# Altium footprint library HSD_connectors.PcbLib: 59 footprints (part 5 of 7)
Each footprint in its own frame and in the unit in brackets; x right, y up, seen from the top. Pads: shape width x height; smd on the part's side, far side on the other; paste and mask are expansions set on the pad; w line width, h text height; cw(c..) or ccw(c..) is an arc to the next point about the centre after c.
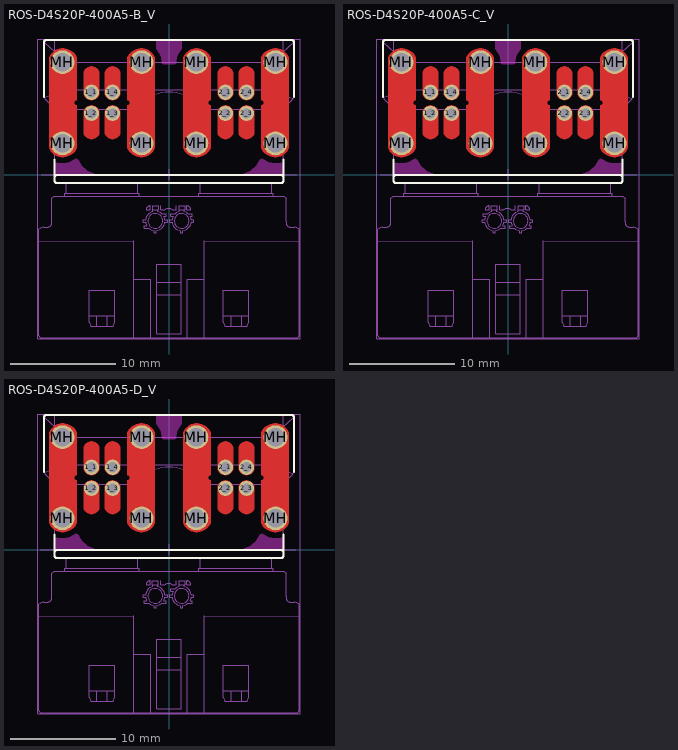
[diagram p4: the footprints below, top view; thin cyan lines are the x and y axes]

## ROS-D4S20P-400A5-B_V [mm] "Dual HSD Right Angle Plug, Edge Mount, 28.25x24.7x8.1mm, Rosenberger Recommended"
height 8.1
pads (16):
  round 1.45 hole 0.95: 1_1(-7.35,7.81) 1_2(-7.35,5.81) 1_3(-5.35,5.81) 1_4(-5.35,7.81) 2_1(5.35,7.81) 2_2(5.35,5.81) 2_3(7.35,5.81) 2_4(7.35,7.81)
  round 2.25 hole 1.75: MH(-10.1,2.96) MH(-10.1,10.66) MH(-2.6,2.96) MH(-2.6,10.66) MH(2.6,2.96) MH(2.6,10.66) MH(10.1,2.96) MH(10.1,10.66)
Top Layer:
  region: -11.35,6.81 -10.1,6.81 -10.1,3.835 -10.214,3.828 -10.435,3.768 -10.633,3.654 -10.794,3.493 -10.908,3.295 -10.968,3.074 -10.968,2.846 -10.908,2.625 -10.794,2.427 -10.633,2.266 -10.435,2.152 -10.214,2.092 -10.1,2.085 -10.1,1.645 -10.2,1.649 -10.396,1.683 -10.586,1.745 -10.765,1.833 -10.93,1.945 -11.078,2.08 -11.205,2.233 -11.31,2.403 -11.35,2.494
  region: -8.1,4.11 -8.1,4.036 -8.071,3.891 -8.015,3.755 -7.933,3.632 -7.828,3.527 -7.705,3.445 -7.569,3.389 -7.424,3.36 -7.35,3.36 -7.35,5.335 -7.443,5.344 -7.614,5.415 -7.745,5.546 -7.816,5.717 -7.816,5.903 -7.745,6.074 -7.614,6.205 -7.443,6.276 -7.35,6.285 -7.35,6.56 -7.424,6.56 -7.569,6.531 -7.705,6.475 -7.828,6.393 -7.933,6.288 -8.015,6.165 -8.071,6.029 -8.1,5.884 -8.1,5.81
  region: -11.35,6.81 -10.1,6.81 -10.1,9.785 -10.214,9.792 -10.435,9.852 -10.633,9.966 -10.794,10.127 -10.908,10.325 -10.968,10.546 -10.968,10.774 -10.908,10.995 -10.794,11.193 -10.633,11.354 -10.435,11.468 -10.214,11.528 -10.1,11.535 -10.1,11.975 -10.2,11.971 -10.396,11.937 -10.586,11.875 -10.765,11.787 -10.93,11.675 -11.078,11.54 -11.205,11.387 -11.31,11.217 -11.35,11.126
  region: -1.35,6.81 -2.6,6.81 -2.6,9.785 -2.486,9.792 -2.265,9.852 -2.067,9.966 -1.906,10.127 -1.792,10.325 -1.732,10.546 -1.732,10.774 -1.792,10.995 -1.906,11.193 -2.067,11.354 -2.265,11.468 -2.486,11.528 -2.6,11.535 -2.6,11.975 -2.5,11.971 -2.304,11.937 -2.114,11.875 -1.935,11.787 -1.77,11.675 -1.622,11.54 -1.495,11.387 -1.39,11.217 -1.35,11.126
  region: -1.35,6.81 -2.6,6.81 -2.6,3.835 -2.486,3.828 -2.265,3.768 -2.067,3.654 -1.906,3.493 -1.792,3.295 -1.732,3.074 -1.732,2.846 -1.792,2.625 -1.906,2.427 -2.067,2.266 -2.265,2.152 -2.486,2.092 -2.6,2.085 -2.6,1.645 -2.5,1.649 -2.304,1.683 -2.114,1.745 -1.935,1.833 -1.77,1.945 -1.622,2.08 -1.495,2.233 -1.39,2.403 -1.35,2.494
  region: -6.6,4.11 -6.6,4.036 -6.629,3.891 -6.685,3.755 -6.767,3.632 -6.872,3.527 -6.995,3.445 -7.131,3.389 -7.276,3.36 -7.35,3.36 -7.35,5.335 -7.257,5.344 -7.086,5.415 -6.955,5.546 -6.884,5.717 -6.884,5.903 -6.955,6.074 -7.086,6.205 -7.257,6.276 -7.35,6.285 -7.35,6.56 -7.276,6.56 -7.131,6.531 -6.995,6.475 -6.872,6.393 -6.767,6.288 -6.685,6.165 -6.629,6.029 -6.6,5.884 -6.6,5.81
  region: -6.1,4.11 -6.1,4.036 -6.071,3.891 -6.015,3.755 -5.933,3.632 -5.828,3.527 -5.705,3.445 -5.569,3.389 -5.424,3.36 -5.35,3.36 -5.35,5.335 -5.443,5.344 -5.614,5.415 -5.745,5.546 -5.816,5.717 -5.816,5.903 -5.745,6.074 -5.614,6.205 -5.443,6.276 -5.35,6.285 -5.35,6.56 -5.424,6.56 -5.569,6.531 -5.705,6.475 -5.828,6.393 -5.933,6.288 -6.015,6.165 -6.071,6.029 -6.1,5.884 -6.1,5.81
  region: -4.6,4.11 -4.6,4.036 -4.629,3.891 -4.685,3.755 -4.767,3.632 -4.872,3.527 -4.995,3.445 -5.131,3.389 -5.276,3.36 -5.35,3.36 -5.35,5.335 -5.257,5.344 -5.086,5.415 -4.955,5.546 -4.884,5.717 -4.884,5.903 -4.955,6.074 -5.086,6.205 -5.257,6.276 -5.35,6.285 -5.35,6.56 -5.276,6.56 -5.131,6.531 -4.995,6.475 -4.872,6.393 -4.767,6.288 -4.685,6.165 -4.629,6.029 -4.6,5.884 -4.6,5.81
  region: -6.1,9.51 -6.1,9.584 -6.071,9.729 -6.015,9.865 -5.933,9.988 -5.828,10.093 -5.705,10.175 -5.569,10.231 -5.424,10.26 -5.35,10.26 -5.35,8.285 -5.443,8.276 -5.614,8.205 -5.745,8.074 -5.816,7.903 -5.816,7.717 -5.745,7.546 -5.614,7.415 -5.443,7.344 -5.35,7.335 -5.35,7.06 -5.424,7.06 -5.569,7.089 -5.705,7.145 -5.828,7.227 -5.933,7.332 -6.015,7.455 -6.071,7.591 -6.1,7.736 -6.1,7.81
  region: -4.6,9.51 -4.6,9.584 -4.629,9.729 -4.685,9.865 -4.767,9.988 -4.872,10.093 -4.995,10.175 -5.131,10.231 -5.276,10.26 -5.35,10.26 -5.35,8.285 -5.257,8.276 -5.086,8.205 -4.955,8.074 -4.884,7.903 -4.884,7.717 -4.955,7.546 -5.086,7.415 -5.257,7.344 -5.35,7.335 -5.35,7.06 -5.276,7.06 -5.131,7.089 -4.995,7.145 -4.872,7.227 -4.767,7.332 -4.685,7.455 -4.629,7.591 -4.6,7.736 -4.6,7.81
  region: -6.6,9.51 -6.6,9.584 -6.629,9.729 -6.685,9.865 -6.767,9.988 -6.872,10.093 -6.995,10.175 -7.131,10.231 -7.276,10.26 -7.35,10.26 -7.35,8.285 -7.257,8.276 -7.086,8.205 -6.955,8.074 -6.884,7.903 -6.884,7.717 -6.955,7.546 -7.086,7.415 -7.257,7.344 -7.35,7.335 -7.35,7.06 -7.276,7.06 -7.131,7.089 -6.995,7.145 -6.872,7.227 -6.767,7.332 -6.685,7.455 -6.629,7.591 -6.6,7.736 -6.6,7.81
  region: -8.1,9.51 -8.1,9.584 -8.071,9.729 -8.015,9.865 -7.933,9.988 -7.828,10.093 -7.705,10.175 -7.569,10.231 -7.424,10.26 -7.35,10.26 -7.35,8.285 -7.443,8.276 -7.614,8.205 -7.745,8.074 -7.816,7.903 -7.816,7.717 -7.745,7.546 -7.614,7.415 -7.443,7.344 -7.35,7.335 -7.35,7.06 -7.424,7.06 -7.569,7.089 -7.705,7.145 -7.828,7.227 -7.933,7.332 -8.015,7.455 -8.071,7.591 -8.1,7.736 -8.1,7.81
  region: 8.1,9.51 8.1,9.584 8.071,9.729 8.015,9.865 7.933,9.988 7.828,10.093 7.705,10.175 7.569,10.231 7.424,10.26 7.35,10.26 7.35,8.285 7.443,8.276 7.614,8.205 7.745,8.074 7.816,7.903 7.816,7.717 7.745,7.546 7.614,7.415 7.443,7.344 7.35,7.335 7.35,7.06 7.424,7.06 7.569,7.089 7.705,7.145 7.828,7.227 7.933,7.332 8.015,7.455 8.071,7.591 8.1,7.736 8.1,7.81
  region: 6.6,9.51 6.6,9.584 6.629,9.729 6.685,9.865 6.767,9.988 6.872,10.093 6.995,10.175 7.131,10.231 7.276,10.26 7.35,10.26 7.35,8.285 7.257,8.276 7.086,8.205 6.955,8.074 6.884,7.903 6.884,7.717 6.955,7.546 7.086,7.415 7.257,7.344 7.35,7.335 7.35,7.06 7.276,7.06 7.131,7.089 6.995,7.145 6.872,7.227 6.767,7.332 6.685,7.455 6.629,7.591 6.6,7.736 6.6,7.81
  region: 4.6,9.51 4.6,9.584 4.629,9.729 4.685,9.865 4.767,9.988 4.872,10.093 4.995,10.175 5.131,10.231 5.276,10.26 5.35,10.26 5.35,8.285 5.257,8.276 5.086,8.205 4.955,8.074 4.884,7.903 4.884,7.717 4.955,7.546 5.086,7.415 5.257,7.344 5.35,7.335 5.35,7.06 5.276,7.06 5.131,7.089 4.995,7.145 4.872,7.227 4.767,7.332 4.685,7.455 4.629,7.591 4.6,7.736 4.6,7.81
  region: 6.1,9.51 6.1,9.584 6.071,9.729 6.015,9.865 5.933,9.988 5.828,10.093 5.705,10.175 5.569,10.231 5.424,10.26 5.35,10.26 5.35,8.285 5.443,8.276 5.614,8.205 5.745,8.074 5.816,7.903 5.816,7.717 5.745,7.546 5.614,7.415 5.443,7.344 5.35,7.335 5.35,7.06 5.424,7.06 5.569,7.089 5.705,7.145 5.828,7.227 5.933,7.332 6.015,7.455 6.071,7.591 6.1,7.736 6.1,7.81
  region: 4.6,4.11 4.6,4.036 4.629,3.891 4.685,3.755 4.767,3.632 4.872,3.527 4.995,3.445 5.131,3.389 5.276,3.36 5.35,3.36 5.35,5.335 5.257,5.344 5.086,5.415 4.955,5.546 4.884,5.717 4.884,5.903 4.955,6.074 5.086,6.205 5.257,6.276 5.35,6.285 5.35,6.56 5.276,6.56 5.131,6.531 4.995,6.475 4.872,6.393 4.767,6.288 4.685,6.165 4.629,6.029 4.6,5.884 4.6,5.81
  region: 6.1,4.11 6.1,4.036 6.071,3.891 6.015,3.755 5.933,3.632 5.828,3.527 5.705,3.445 5.569,3.389 5.424,3.36 5.35,3.36 5.35,5.335 5.443,5.344 5.614,5.415 5.745,5.546 5.816,5.717 5.816,5.903 5.745,6.074 5.614,6.205 5.443,6.276 5.35,6.285 5.35,6.56 5.424,6.56 5.569,6.531 5.705,6.475 5.828,6.393 5.933,6.288 6.015,6.165 6.071,6.029 6.1,5.884 6.1,5.81
  region: 6.6,4.11 6.6,4.036 6.629,3.891 6.685,3.755 6.767,3.632 6.872,3.527 6.995,3.445 7.131,3.389 7.276,3.36 7.35,3.36 7.35,5.335 7.257,5.344 7.086,5.415 6.955,5.546 6.884,5.717 6.884,5.903 6.955,6.074 7.086,6.205 7.257,6.276 7.35,6.285 7.35,6.56 7.276,6.56 7.131,6.531 6.995,6.475 6.872,6.393 6.767,6.288 6.685,6.165 6.629,6.029 6.6,5.884 6.6,5.81
  region: 1.35,6.81 2.6,6.81 2.6,3.835 2.486,3.828 2.265,3.768 2.067,3.654 1.906,3.493 1.792,3.295 1.732,3.074 1.732,2.846 1.792,2.625 1.906,2.427 2.067,2.266 2.265,2.152 2.486,2.092 2.6,2.085 2.6,1.645 2.5,1.649 2.304,1.683 2.114,1.745 1.935,1.833 1.77,1.945 1.622,2.08 1.495,2.233 1.39,2.403 1.35,2.494
  region: 1.35,6.81 2.6,6.81 2.6,9.785 2.486,9.792 2.265,9.852 2.067,9.966 1.906,10.127 1.792,10.325 1.732,10.546 1.732,10.774 1.792,10.995 1.906,11.193 2.067,11.354 2.265,11.468 2.486,11.528 2.6,11.535 2.6,11.975 2.5,11.971 2.304,11.937 2.114,11.875 1.935,11.787 1.77,11.675 1.622,11.54 1.495,11.387 1.39,11.217 1.35,11.126
  region: 11.35,6.81 10.1,6.81 10.1,9.785 10.214,9.792 10.435,9.852 10.633,9.966 10.794,10.127 10.908,10.325 10.968,10.546 10.968,10.774 10.908,10.995 10.794,11.193 10.633,11.354 10.435,11.468 10.214,11.528 10.1,11.535 10.1,11.975 10.2,11.971 10.396,11.937 10.586,11.875 10.765,11.787 10.93,11.675 11.078,11.54 11.205,11.387 11.31,11.217 11.35,11.126
  region: 8.1,4.11 8.1,4.036 8.071,3.891 8.015,3.755 7.933,3.632 7.828,3.527 7.705,3.445 7.569,3.389 7.424,3.36 7.35,3.36 7.35,5.335 7.443,5.344 7.614,5.415 7.745,5.546 7.816,5.717 7.816,5.903 7.745,6.074 7.614,6.205 7.443,6.276 7.35,6.285 7.35,6.56 7.424,6.56 7.569,6.531 7.705,6.475 7.828,6.393 7.933,6.288 8.015,6.165 8.071,6.029 8.1,5.884 8.1,5.81
  region: 10.1,1.645 9.995,1.645 9.786,1.675 9.584,1.733 9.392,1.819 9.214,1.931 9.053,2.067 8.913,2.224 8.796,2.399 8.75,2.494 8.75,6.57 8.797,6.575 8.883,6.61 8.95,6.677 8.985,6.763 8.99,6.81 10.1,6.81 10.1,3.835 9.986,3.828 9.765,3.768 9.567,3.654 9.406,3.493 9.292,3.295 9.232,3.074 9.232,2.846 9.292,2.625 9.406,2.427 9.567,2.266 9.765,2.152 9.986,2.092 10.1,2.085
  region: 11.35,6.81 10.1,6.81 10.1,3.835 10.214,3.828 10.435,3.768 10.633,3.654 10.794,3.493 10.908,3.295 10.968,3.074 10.968,2.846 10.908,2.625 10.794,2.427 10.633,2.266 10.435,2.152 10.214,2.092 10.1,2.085 10.1,1.645 10.2,1.649 10.396,1.683 10.586,1.745 10.765,1.833 10.93,1.945 11.078,2.08 11.205,2.233 11.31,2.403 11.35,2.494
  region: 10.1,11.975 9.995,11.975 9.786,11.945 9.584,11.887 9.392,11.801 9.214,11.689 9.053,11.553 8.913,11.396 8.796,11.221 8.75,11.126 8.75,7.05 8.797,7.045 8.883,7.01 8.95,6.943 8.985,6.857 8.99,6.81 10.1,6.81 10.1,9.785 9.986,9.792 9.765,9.852 9.567,9.966 9.406,10.127 9.292,10.325 9.232,10.546 9.232,10.774 9.292,10.995 9.406,11.193 9.567,11.354 9.765,11.468 9.986,11.528 10.1,11.535
  region: 2.6,11.975 2.705,11.975 2.914,11.945 3.116,11.887 3.308,11.801 3.486,11.689 3.647,11.553 3.787,11.396 3.904,11.221 3.95,11.126 3.95,7.05 3.903,7.045 3.817,7.01 3.75,6.943 3.715,6.857 3.71,6.81 2.6,6.81 2.6,9.785 2.714,9.792 2.935,9.852 3.133,9.966 3.294,10.127 3.408,10.325 3.468,10.546 3.468,10.774 3.408,10.995 3.294,11.193 3.133,11.354 2.935,11.468 2.714,11.528 2.6,11.535
  region: 2.6,1.645 2.705,1.645 2.914,1.675 3.116,1.733 3.308,1.819 3.486,1.931 3.647,2.067 3.787,2.224 3.904,2.399 3.95,2.494 3.95,6.57 3.903,6.575 3.817,6.61 3.75,6.677 3.715,6.763 3.71,6.81 2.6,6.81 2.6,3.835 2.714,3.828 2.935,3.768 3.133,3.654 3.294,3.493 3.408,3.295 3.468,3.074 3.468,2.846 3.408,2.625 3.294,2.427 3.133,2.266 2.935,2.152 2.714,2.092 2.6,2.085
  region: -10.1,11.975 -9.995,11.975 -9.786,11.945 -9.584,11.887 -9.392,11.801 -9.214,11.689 -9.053,11.553 -8.913,11.396 -8.796,11.221 -8.75,11.126 -8.75,7.05 -8.797,7.045 -8.883,7.01 -8.95,6.943 -8.985,6.857 -8.99,6.81 -10.1,6.81 -10.1,9.785 -9.986,9.792 -9.765,9.852 -9.567,9.966 -9.406,10.127 -9.292,10.325 -9.232,10.546 -9.232,10.774 -9.292,10.995 -9.406,11.193 -9.567,11.354 -9.765,11.468 -9.986,11.528 -10.1,11.535
  region: -10.1,1.645 -9.995,1.645 -9.786,1.675 -9.584,1.733 -9.392,1.819 -9.214,1.931 -9.053,2.067 -8.913,2.224 -8.796,2.399 -8.75,2.494 -8.75,6.57 -8.797,6.575 -8.883,6.61 -8.95,6.677 -8.985,6.763 -8.99,6.81 -10.1,6.81 -10.1,3.835 -9.986,3.828 -9.765,3.768 -9.567,3.654 -9.406,3.493 -9.292,3.295 -9.232,3.074 -9.232,2.846 -9.292,2.625 -9.406,2.427 -9.567,2.266 -9.765,2.152 -9.986,2.092 -10.1,2.085
  region: -2.6,11.975 -2.705,11.975 -2.914,11.945 -3.116,11.887 -3.308,11.801 -3.486,11.689 -3.647,11.553 -3.787,11.396 -3.904,11.221 -3.95,11.126 -3.95,7.05 -3.903,7.045 -3.817,7.01 -3.75,6.943 -3.715,6.857 -3.71,6.81 -2.6,6.81 -2.6,9.785 -2.714,9.792 -2.935,9.852 -3.133,9.966 -3.294,10.127 -3.408,10.325 -3.468,10.546 -3.468,10.774 -3.408,10.995 -3.294,11.193 -3.133,11.354 -2.935,11.468 -2.714,11.528 -2.6,11.535
  region: -2.6,1.645 -2.705,1.645 -2.914,1.675 -3.116,1.733 -3.308,1.819 -3.486,1.931 -3.647,2.067 -3.787,2.224 -3.904,2.399 -3.95,2.494 -3.95,6.57 -3.903,6.575 -3.817,6.61 -3.75,6.677 -3.715,6.763 -3.71,6.81 -2.6,6.81 -2.6,3.835 -2.714,3.828 -2.935,3.768 -3.133,3.654 -3.294,3.493 -3.408,3.295 -3.468,3.074 -3.468,2.846 -3.408,2.625 -3.294,2.427 -3.133,2.266 -2.935,2.152 -2.714,2.092 -2.6,2.085
Top Overlay:
  lines w0.2: -11.85,7.343 -11.85,12.56 cw(c-11.65,12.56) -11.65,12.76 -10.85,12.76 10.85,12.76 11.65,12.76 cw(c11.65,12.56) 11.85,12.56 11.85,7.343 ; -10.85,1.426 -10.85,-0.24 ; 10.85,1.426 10.85,-0.24 ; -10.85,-0.24 cw(c-10.65,-0.24) -10.65,-0.04 10.65,-0.04 cw(c10.65,-0.24) 10.85,-0.24 ; -10.85,-0.24 -10.85,-0.59 ccw(c-10.65,-0.59) -10.65,-0.79 10.65,-0.79 ccw(c10.65,-0.59) 10.85,-0.59 10.85,-0.24
Top Paste:
  drawing of 16 lines, arcs and shapes, not listed
Keep-Out Layer:
  region: 10.85,0 10.85,0.933 10.75,1.106 10.65,1.133 10.598,1.126 10.016,1.062 9.442,1.178 8.93,1.463 8.837,1.503 8.787,1.504 8.737,1.493 8.627,1.392 8.274,0.849 7.795,0.414 7.643,0.315 6.961,0.035 6.961,-0.003
  region: -10.85,0 -10.85,0.933 -10.75,1.106 -10.65,1.133 -10.598,1.126 -10.016,1.062 -9.442,1.178 -8.93,1.463 -8.837,1.503 -8.787,1.504 -8.737,1.493 -8.627,1.392 -8.274,0.849 -7.795,0.414 -7.643,0.315 -6.961,0.035 -6.961,-0.003
  region: -0.7,10.66 -0.753,11.108 -0.911,11.531 -1.192,11.945 -1.208,11.989 -1.207,12.611 -1.187,12.66 -1.143,12.76 1.143,12.76 1.187,12.66 1.207,12.611 1.208,11.989 1.192,11.945 0.911,11.531 0.753,11.108 0.7,10.66 0.673,10.56 0.641,10.518 0.551,10.467 -0.551,10.467 -0.641,10.518 -0.673,10.56
Mechanical 3:
  lines w0.1: -12.1,0 12.1,0
  text "Board Edge" at -11.8,-0.6 h0.2
Mechanical 13:
  drawing of 192 lines, arcs and shapes, not listed
  text ".Designator" at -2.401,0.297 h2.69
Mechanical 15:
  lines w0.05: -12.45,-15.59 -12.45,12.86 12.45,12.86 12.45,-15.59 -12.45,-15.59
  lines w0.1: -0.5,0 0.5,0 ; 0,-0.5 0,0.5
3D body "d4s20p-400A5-B.stp": height 11, standoff -3.2, extent -12.35,-15.49 12.35,12.76

## ROS-D4S20P-400A5-C_V [mm] "Dual HSD Right Angle Plug, Edge Mount, 28.25x24.7x8.1mm, Rosenberger Recommended"
height 8.1
pads (16):
  round 1.45 hole 0.95: 1_1(-7.35,7.81) 1_2(-7.35,5.81) 1_3(-5.35,5.81) 1_4(-5.35,7.81) 2_1(5.35,7.81) 2_2(5.35,5.81) 2_3(7.35,5.81) 2_4(7.35,7.81)
  round 2.25 hole 1.75: MH(-10.1,2.96) MH(-10.1,10.66) MH(-2.6,2.96) MH(-2.6,10.66) MH(2.6,2.96) MH(2.6,10.66) MH(10.1,2.96) MH(10.1,10.66)
Top Layer:
  region: -11.35,6.81 -10.1,6.81 -10.1,3.835 -10.214,3.828 -10.435,3.768 -10.633,3.654 -10.794,3.493 -10.908,3.295 -10.968,3.074 -10.968,2.846 -10.908,2.625 -10.794,2.427 -10.633,2.266 -10.435,2.152 -10.214,2.092 -10.1,2.085 -10.1,1.645 -10.2,1.649 -10.396,1.683 -10.586,1.745 -10.765,1.833 -10.93,1.945 -11.078,2.08 -11.205,2.233 -11.31,2.403 -11.35,2.494
  region: -8.1,4.11 -8.1,4.036 -8.071,3.891 -8.015,3.755 -7.933,3.632 -7.828,3.527 -7.705,3.445 -7.569,3.389 -7.424,3.36 -7.35,3.36 -7.35,5.335 -7.443,5.344 -7.614,5.415 -7.745,5.546 -7.816,5.717 -7.816,5.903 -7.745,6.074 -7.614,6.205 -7.443,6.276 -7.35,6.285 -7.35,6.56 -7.424,6.56 -7.569,6.531 -7.705,6.475 -7.828,6.393 -7.933,6.288 -8.015,6.165 -8.071,6.029 -8.1,5.884 -8.1,5.81
  region: -11.35,6.81 -10.1,6.81 -10.1,9.785 -10.214,9.792 -10.435,9.852 -10.633,9.966 -10.794,10.127 -10.908,10.325 -10.968,10.546 -10.968,10.774 -10.908,10.995 -10.794,11.193 -10.633,11.354 -10.435,11.468 -10.214,11.528 -10.1,11.535 -10.1,11.975 -10.2,11.971 -10.396,11.937 -10.586,11.875 -10.765,11.787 -10.93,11.675 -11.078,11.54 -11.205,11.387 -11.31,11.217 -11.35,11.126
  region: -1.35,6.81 -2.6,6.81 -2.6,9.785 -2.486,9.792 -2.265,9.852 -2.067,9.966 -1.906,10.127 -1.792,10.325 -1.732,10.546 -1.732,10.774 -1.792,10.995 -1.906,11.193 -2.067,11.354 -2.265,11.468 -2.486,11.528 -2.6,11.535 -2.6,11.975 -2.5,11.971 -2.304,11.937 -2.114,11.875 -1.935,11.787 -1.77,11.675 -1.622,11.54 -1.495,11.387 -1.39,11.217 -1.35,11.126
  region: -1.35,6.81 -2.6,6.81 -2.6,3.835 -2.486,3.828 -2.265,3.768 -2.067,3.654 -1.906,3.493 -1.792,3.295 -1.732,3.074 -1.732,2.846 -1.792,2.625 -1.906,2.427 -2.067,2.266 -2.265,2.152 -2.486,2.092 -2.6,2.085 -2.6,1.645 -2.5,1.649 -2.304,1.683 -2.114,1.745 -1.935,1.833 -1.77,1.945 -1.622,2.08 -1.495,2.233 -1.39,2.403 -1.35,2.494
  region: -6.6,4.11 -6.6,4.036 -6.629,3.891 -6.685,3.755 -6.767,3.632 -6.872,3.527 -6.995,3.445 -7.131,3.389 -7.276,3.36 -7.35,3.36 -7.35,5.335 -7.257,5.344 -7.086,5.415 -6.955,5.546 -6.884,5.717 -6.884,5.903 -6.955,6.074 -7.086,6.205 -7.257,6.276 -7.35,6.285 -7.35,6.56 -7.276,6.56 -7.131,6.531 -6.995,6.475 -6.872,6.393 -6.767,6.288 -6.685,6.165 -6.629,6.029 -6.6,5.884 -6.6,5.81
  region: -6.1,4.11 -6.1,4.036 -6.071,3.891 -6.015,3.755 -5.933,3.632 -5.828,3.527 -5.705,3.445 -5.569,3.389 -5.424,3.36 -5.35,3.36 -5.35,5.335 -5.443,5.344 -5.614,5.415 -5.745,5.546 -5.816,5.717 -5.816,5.903 -5.745,6.074 -5.614,6.205 -5.443,6.276 -5.35,6.285 -5.35,6.56 -5.424,6.56 -5.569,6.531 -5.705,6.475 -5.828,6.393 -5.933,6.288 -6.015,6.165 -6.071,6.029 -6.1,5.884 -6.1,5.81
  region: -4.6,4.11 -4.6,4.036 -4.629,3.891 -4.685,3.755 -4.767,3.632 -4.872,3.527 -4.995,3.445 -5.131,3.389 -5.276,3.36 -5.35,3.36 -5.35,5.335 -5.257,5.344 -5.086,5.415 -4.955,5.546 -4.884,5.717 -4.884,5.903 -4.955,6.074 -5.086,6.205 -5.257,6.276 -5.35,6.285 -5.35,6.56 -5.276,6.56 -5.131,6.531 -4.995,6.475 -4.872,6.393 -4.767,6.288 -4.685,6.165 -4.629,6.029 -4.6,5.884 -4.6,5.81
  region: -6.1,9.51 -6.1,9.584 -6.071,9.729 -6.015,9.865 -5.933,9.988 -5.828,10.093 -5.705,10.175 -5.569,10.231 -5.424,10.26 -5.35,10.26 -5.35,8.285 -5.443,8.276 -5.614,8.205 -5.745,8.074 -5.816,7.903 -5.816,7.717 -5.745,7.546 -5.614,7.415 -5.443,7.344 -5.35,7.335 -5.35,7.06 -5.424,7.06 -5.569,7.089 -5.705,7.145 -5.828,7.227 -5.933,7.332 -6.015,7.455 -6.071,7.591 -6.1,7.736 -6.1,7.81
  region: -4.6,9.51 -4.6,9.584 -4.629,9.729 -4.685,9.865 -4.767,9.988 -4.872,10.093 -4.995,10.175 -5.131,10.231 -5.276,10.26 -5.35,10.26 -5.35,8.285 -5.257,8.276 -5.086,8.205 -4.955,8.074 -4.884,7.903 -4.884,7.717 -4.955,7.546 -5.086,7.415 -5.257,7.344 -5.35,7.335 -5.35,7.06 -5.276,7.06 -5.131,7.089 -4.995,7.145 -4.872,7.227 -4.767,7.332 -4.685,7.455 -4.629,7.591 -4.6,7.736 -4.6,7.81
  region: -6.6,9.51 -6.6,9.584 -6.629,9.729 -6.685,9.865 -6.767,9.988 -6.872,10.093 -6.995,10.175 -7.131,10.231 -7.276,10.26 -7.35,10.26 -7.35,8.285 -7.257,8.276 -7.086,8.205 -6.955,8.074 -6.884,7.903 -6.884,7.717 -6.955,7.546 -7.086,7.415 -7.257,7.344 -7.35,7.335 -7.35,7.06 -7.276,7.06 -7.131,7.089 -6.995,7.145 -6.872,7.227 -6.767,7.332 -6.685,7.455 -6.629,7.591 -6.6,7.736 -6.6,7.81
  region: -8.1,9.51 -8.1,9.584 -8.071,9.729 -8.015,9.865 -7.933,9.988 -7.828,10.093 -7.705,10.175 -7.569,10.231 -7.424,10.26 -7.35,10.26 -7.35,8.285 -7.443,8.276 -7.614,8.205 -7.745,8.074 -7.816,7.903 -7.816,7.717 -7.745,7.546 -7.614,7.415 -7.443,7.344 -7.35,7.335 -7.35,7.06 -7.424,7.06 -7.569,7.089 -7.705,7.145 -7.828,7.227 -7.933,7.332 -8.015,7.455 -8.071,7.591 -8.1,7.736 -8.1,7.81
  region: 8.1,9.51 8.1,9.584 8.071,9.729 8.015,9.865 7.933,9.988 7.828,10.093 7.705,10.175 7.569,10.231 7.424,10.26 7.35,10.26 7.35,8.285 7.443,8.276 7.614,8.205 7.745,8.074 7.816,7.903 7.816,7.717 7.745,7.546 7.614,7.415 7.443,7.344 7.35,7.335 7.35,7.06 7.424,7.06 7.569,7.089 7.705,7.145 7.828,7.227 7.933,7.332 8.015,7.455 8.071,7.591 8.1,7.736 8.1,7.81
  region: 6.6,9.51 6.6,9.584 6.629,9.729 6.685,9.865 6.767,9.988 6.872,10.093 6.995,10.175 7.131,10.231 7.276,10.26 7.35,10.26 7.35,8.285 7.257,8.276 7.086,8.205 6.955,8.074 6.884,7.903 6.884,7.717 6.955,7.546 7.086,7.415 7.257,7.344 7.35,7.335 7.35,7.06 7.276,7.06 7.131,7.089 6.995,7.145 6.872,7.227 6.767,7.332 6.685,7.455 6.629,7.591 6.6,7.736 6.6,7.81
  region: 4.6,9.51 4.6,9.584 4.629,9.729 4.685,9.865 4.767,9.988 4.872,10.093 4.995,10.175 5.131,10.231 5.276,10.26 5.35,10.26 5.35,8.285 5.257,8.276 5.086,8.205 4.955,8.074 4.884,7.903 4.884,7.717 4.955,7.546 5.086,7.415 5.257,7.344 5.35,7.335 5.35,7.06 5.276,7.06 5.131,7.089 4.995,7.145 4.872,7.227 4.767,7.332 4.685,7.455 4.629,7.591 4.6,7.736 4.6,7.81
  region: 6.1,9.51 6.1,9.584 6.071,9.729 6.015,9.865 5.933,9.988 5.828,10.093 5.705,10.175 5.569,10.231 5.424,10.26 5.35,10.26 5.35,8.285 5.443,8.276 5.614,8.205 5.745,8.074 5.816,7.903 5.816,7.717 5.745,7.546 5.614,7.415 5.443,7.344 5.35,7.335 5.35,7.06 5.424,7.06 5.569,7.089 5.705,7.145 5.828,7.227 5.933,7.332 6.015,7.455 6.071,7.591 6.1,7.736 6.1,7.81
  region: 4.6,4.11 4.6,4.036 4.629,3.891 4.685,3.755 4.767,3.632 4.872,3.527 4.995,3.445 5.131,3.389 5.276,3.36 5.35,3.36 5.35,5.335 5.257,5.344 5.086,5.415 4.955,5.546 4.884,5.717 4.884,5.903 4.955,6.074 5.086,6.205 5.257,6.276 5.35,6.285 5.35,6.56 5.276,6.56 5.131,6.531 4.995,6.475 4.872,6.393 4.767,6.288 4.685,6.165 4.629,6.029 4.6,5.884 4.6,5.81
  region: 6.1,4.11 6.1,4.036 6.071,3.891 6.015,3.755 5.933,3.632 5.828,3.527 5.705,3.445 5.569,3.389 5.424,3.36 5.35,3.36 5.35,5.335 5.443,5.344 5.614,5.415 5.745,5.546 5.816,5.717 5.816,5.903 5.745,6.074 5.614,6.205 5.443,6.276 5.35,6.285 5.35,6.56 5.424,6.56 5.569,6.531 5.705,6.475 5.828,6.393 5.933,6.288 6.015,6.165 6.071,6.029 6.1,5.884 6.1,5.81
  region: 6.6,4.11 6.6,4.036 6.629,3.891 6.685,3.755 6.767,3.632 6.872,3.527 6.995,3.445 7.131,3.389 7.276,3.36 7.35,3.36 7.35,5.335 7.257,5.344 7.086,5.415 6.955,5.546 6.884,5.717 6.884,5.903 6.955,6.074 7.086,6.205 7.257,6.276 7.35,6.285 7.35,6.56 7.276,6.56 7.131,6.531 6.995,6.475 6.872,6.393 6.767,6.288 6.685,6.165 6.629,6.029 6.6,5.884 6.6,5.81
  region: 1.35,6.81 2.6,6.81 2.6,3.835 2.486,3.828 2.265,3.768 2.067,3.654 1.906,3.493 1.792,3.295 1.732,3.074 1.732,2.846 1.792,2.625 1.906,2.427 2.067,2.266 2.265,2.152 2.486,2.092 2.6,2.085 2.6,1.645 2.5,1.649 2.304,1.683 2.114,1.745 1.935,1.833 1.77,1.945 1.622,2.08 1.495,2.233 1.39,2.403 1.35,2.494
  region: 1.35,6.81 2.6,6.81 2.6,9.785 2.486,9.792 2.265,9.852 2.067,9.966 1.906,10.127 1.792,10.325 1.732,10.546 1.732,10.774 1.792,10.995 1.906,11.193 2.067,11.354 2.265,11.468 2.486,11.528 2.6,11.535 2.6,11.975 2.5,11.971 2.304,11.937 2.114,11.875 1.935,11.787 1.77,11.675 1.622,11.54 1.495,11.387 1.39,11.217 1.35,11.126
  region: 11.35,6.81 10.1,6.81 10.1,9.785 10.214,9.792 10.435,9.852 10.633,9.966 10.794,10.127 10.908,10.325 10.968,10.546 10.968,10.774 10.908,10.995 10.794,11.193 10.633,11.354 10.435,11.468 10.214,11.528 10.1,11.535 10.1,11.975 10.2,11.971 10.396,11.937 10.586,11.875 10.765,11.787 10.93,11.675 11.078,11.54 11.205,11.387 11.31,11.217 11.35,11.126
  region: 8.1,4.11 8.1,4.036 8.071,3.891 8.015,3.755 7.933,3.632 7.828,3.527 7.705,3.445 7.569,3.389 7.424,3.36 7.35,3.36 7.35,5.335 7.443,5.344 7.614,5.415 7.745,5.546 7.816,5.717 7.816,5.903 7.745,6.074 7.614,6.205 7.443,6.276 7.35,6.285 7.35,6.56 7.424,6.56 7.569,6.531 7.705,6.475 7.828,6.393 7.933,6.288 8.015,6.165 8.071,6.029 8.1,5.884 8.1,5.81
  region: 10.1,1.645 9.995,1.645 9.786,1.675 9.584,1.733 9.392,1.819 9.214,1.931 9.053,2.067 8.913,2.224 8.796,2.399 8.75,2.494 8.75,6.57 8.797,6.575 8.883,6.61 8.95,6.677 8.985,6.763 8.99,6.81 10.1,6.81 10.1,3.835 9.986,3.828 9.765,3.768 9.567,3.654 9.406,3.493 9.292,3.295 9.232,3.074 9.232,2.846 9.292,2.625 9.406,2.427 9.567,2.266 9.765,2.152 9.986,2.092 10.1,2.085
  region: 11.35,6.81 10.1,6.81 10.1,3.835 10.214,3.828 10.435,3.768 10.633,3.654 10.794,3.493 10.908,3.295 10.968,3.074 10.968,2.846 10.908,2.625 10.794,2.427 10.633,2.266 10.435,2.152 10.214,2.092 10.1,2.085 10.1,1.645 10.2,1.649 10.396,1.683 10.586,1.745 10.765,1.833 10.93,1.945 11.078,2.08 11.205,2.233 11.31,2.403 11.35,2.494
  region: 10.1,11.975 9.995,11.975 9.786,11.945 9.584,11.887 9.392,11.801 9.214,11.689 9.053,11.553 8.913,11.396 8.796,11.221 8.75,11.126 8.75,7.05 8.797,7.045 8.883,7.01 8.95,6.943 8.985,6.857 8.99,6.81 10.1,6.81 10.1,9.785 9.986,9.792 9.765,9.852 9.567,9.966 9.406,10.127 9.292,10.325 9.232,10.546 9.232,10.774 9.292,10.995 9.406,11.193 9.567,11.354 9.765,11.468 9.986,11.528 10.1,11.535
  region: 2.6,11.975 2.705,11.975 2.914,11.945 3.116,11.887 3.308,11.801 3.486,11.689 3.647,11.553 3.787,11.396 3.904,11.221 3.95,11.126 3.95,7.05 3.903,7.045 3.817,7.01 3.75,6.943 3.715,6.857 3.71,6.81 2.6,6.81 2.6,9.785 2.714,9.792 2.935,9.852 3.133,9.966 3.294,10.127 3.408,10.325 3.468,10.546 3.468,10.774 3.408,10.995 3.294,11.193 3.133,11.354 2.935,11.468 2.714,11.528 2.6,11.535
  region: 2.6,1.645 2.705,1.645 2.914,1.675 3.116,1.733 3.308,1.819 3.486,1.931 3.647,2.067 3.787,2.224 3.904,2.399 3.95,2.494 3.95,6.57 3.903,6.575 3.817,6.61 3.75,6.677 3.715,6.763 3.71,6.81 2.6,6.81 2.6,3.835 2.714,3.828 2.935,3.768 3.133,3.654 3.294,3.493 3.408,3.295 3.468,3.074 3.468,2.846 3.408,2.625 3.294,2.427 3.133,2.266 2.935,2.152 2.714,2.092 2.6,2.085
  region: -10.1,11.975 -9.995,11.975 -9.786,11.945 -9.584,11.887 -9.392,11.801 -9.214,11.689 -9.053,11.553 -8.913,11.396 -8.796,11.221 -8.75,11.126 -8.75,7.05 -8.797,7.045 -8.883,7.01 -8.95,6.943 -8.985,6.857 -8.99,6.81 -10.1,6.81 -10.1,9.785 -9.986,9.792 -9.765,9.852 -9.567,9.966 -9.406,10.127 -9.292,10.325 -9.232,10.546 -9.232,10.774 -9.292,10.995 -9.406,11.193 -9.567,11.354 -9.765,11.468 -9.986,11.528 -10.1,11.535
  region: -10.1,1.645 -9.995,1.645 -9.786,1.675 -9.584,1.733 -9.392,1.819 -9.214,1.931 -9.053,2.067 -8.913,2.224 -8.796,2.399 -8.75,2.494 -8.75,6.57 -8.797,6.575 -8.883,6.61 -8.95,6.677 -8.985,6.763 -8.99,6.81 -10.1,6.81 -10.1,3.835 -9.986,3.828 -9.765,3.768 -9.567,3.654 -9.406,3.493 -9.292,3.295 -9.232,3.074 -9.232,2.846 -9.292,2.625 -9.406,2.427 -9.567,2.266 -9.765,2.152 -9.986,2.092 -10.1,2.085
  region: -2.6,11.975 -2.705,11.975 -2.914,11.945 -3.116,11.887 -3.308,11.801 -3.486,11.689 -3.647,11.553 -3.787,11.396 -3.904,11.221 -3.95,11.126 -3.95,7.05 -3.903,7.045 -3.817,7.01 -3.75,6.943 -3.715,6.857 -3.71,6.81 -2.6,6.81 -2.6,9.785 -2.714,9.792 -2.935,9.852 -3.133,9.966 -3.294,10.127 -3.408,10.325 -3.468,10.546 -3.468,10.774 -3.408,10.995 -3.294,11.193 -3.133,11.354 -2.935,11.468 -2.714,11.528 -2.6,11.535
  region: -2.6,1.645 -2.705,1.645 -2.914,1.675 -3.116,1.733 -3.308,1.819 -3.486,1.931 -3.647,2.067 -3.787,2.224 -3.904,2.399 -3.95,2.494 -3.95,6.57 -3.903,6.575 -3.817,6.61 -3.75,6.677 -3.715,6.763 -3.71,6.81 -2.6,6.81 -2.6,3.835 -2.714,3.828 -2.935,3.768 -3.133,3.654 -3.294,3.493 -3.408,3.295 -3.468,3.074 -3.468,2.846 -3.408,2.625 -3.294,2.427 -3.133,2.266 -2.935,2.152 -2.714,2.092 -2.6,2.085
Top Overlay:
  lines w0.2: -11.85,7.343 -11.85,12.56 cw(c-11.65,12.56) -11.65,12.76 -10.85,12.76 10.85,12.76 11.65,12.76 cw(c11.65,12.56) 11.85,12.56 11.85,7.343 ; -10.85,1.426 -10.85,-0.24 ; 10.85,1.426 10.85,-0.24 ; -10.85,-0.24 cw(c-10.65,-0.24) -10.65,-0.04 10.65,-0.04 cw(c10.65,-0.24) 10.85,-0.24 ; -10.85,-0.24 -10.85,-0.59 ccw(c-10.65,-0.59) -10.65,-0.79 10.65,-0.79 ccw(c10.65,-0.59) 10.85,-0.59 10.85,-0.24
Top Paste:
  drawing of 16 lines, arcs and shapes, not listed
Keep-Out Layer:
  region: 10.85,0 10.85,0.933 10.75,1.106 10.65,1.133 10.598,1.126 10.016,1.062 9.442,1.178 8.93,1.463 8.837,1.503 8.787,1.504 8.737,1.493 8.627,1.392 8.274,0.849 7.795,0.414 7.643,0.315 6.961,0.035 6.961,-0.003
  region: -10.85,0 -10.85,0.933 -10.75,1.106 -10.65,1.133 -10.598,1.126 -10.016,1.062 -9.442,1.178 -8.93,1.463 -8.837,1.503 -8.787,1.504 -8.737,1.493 -8.627,1.392 -8.274,0.849 -7.795,0.414 -7.643,0.315 -6.961,0.035 -6.961,-0.003
  region: -0.7,10.66 -0.753,11.108 -0.911,11.531 -1.192,11.945 -1.208,11.989 -1.207,12.611 -1.187,12.66 -1.143,12.76 1.143,12.76 1.187,12.66 1.207,12.611 1.208,11.989 1.192,11.945 0.911,11.531 0.753,11.108 0.7,10.66 0.673,10.56 0.641,10.518 0.551,10.467 -0.551,10.467 -0.641,10.518 -0.673,10.56
Mechanical 3:
  lines w0.1: -12.1,0 12.2,0
  text "Board Edge" at -11.9,-0.6 h0.2
Mechanical 13:
  drawing of 191 lines, arcs and shapes, not listed
  text ".Designator" at -2.401,0.17 h2.69
Mechanical 15:
  lines w0.05: -12.45,-15.59 12.45,-15.59 12.45,12.86 -12.45,12.86 -12.45,-15.59
  lines w0.1: -0.5,0 0.5,0 ; 0,-0.5 0,0.5
3D body "d4s20p-400A5-C.stp": height 11, standoff -3.2, extent -12.35,-15.49 12.35,12.76

## ROS-D4S20P-400A5-D_V [mm] "Dual HSD Right Angle Plug, Edge Mount, 28.25x24.7x8.1mm, Rosenberger Recommended"
height 8.1
pads (16):
  round 1.45 hole 0.95: 1_1(-7.35,7.81) 1_2(-7.35,5.81) 1_3(-5.35,5.81) 1_4(-5.35,7.81) 2_1(5.35,7.81) 2_2(5.35,5.81) 2_3(7.35,5.81) 2_4(7.35,7.81)
  round 2.25 hole 1.75: MH(-10.1,2.96) MH(-10.1,10.66) MH(-2.6,2.96) MH(-2.6,10.66) MH(2.6,2.96) MH(2.6,10.66) MH(10.1,2.96) MH(10.1,10.66)
Top Layer:
  region: -11.35,6.81 -10.1,6.81 -10.1,3.835 -10.214,3.828 -10.435,3.768 -10.633,3.654 -10.794,3.493 -10.908,3.295 -10.968,3.074 -10.968,2.846 -10.908,2.625 -10.794,2.427 -10.633,2.266 -10.435,2.152 -10.214,2.092 -10.1,2.085 -10.1,1.645 -10.2,1.649 -10.396,1.683 -10.586,1.745 -10.765,1.833 -10.93,1.945 -11.078,2.08 -11.205,2.233 -11.31,2.403 -11.35,2.494
  region: -8.1,4.11 -8.1,4.036 -8.071,3.891 -8.015,3.755 -7.933,3.632 -7.828,3.527 -7.705,3.445 -7.569,3.389 -7.424,3.36 -7.35,3.36 -7.35,5.335 -7.443,5.344 -7.614,5.415 -7.745,5.546 -7.816,5.717 -7.816,5.903 -7.745,6.074 -7.614,6.205 -7.443,6.276 -7.35,6.285 -7.35,6.56 -7.424,6.56 -7.569,6.531 -7.705,6.475 -7.828,6.393 -7.933,6.288 -8.015,6.165 -8.071,6.029 -8.1,5.884 -8.1,5.81
  region: -11.35,6.81 -10.1,6.81 -10.1,9.785 -10.214,9.792 -10.435,9.852 -10.633,9.966 -10.794,10.127 -10.908,10.325 -10.968,10.546 -10.968,10.774 -10.908,10.995 -10.794,11.193 -10.633,11.354 -10.435,11.468 -10.214,11.528 -10.1,11.535 -10.1,11.975 -10.2,11.971 -10.396,11.937 -10.586,11.875 -10.765,11.787 -10.93,11.675 -11.078,11.54 -11.205,11.387 -11.31,11.217 -11.35,11.126
  region: -1.35,6.81 -2.6,6.81 -2.6,9.785 -2.486,9.792 -2.265,9.852 -2.067,9.966 -1.906,10.127 -1.792,10.325 -1.732,10.546 -1.732,10.774 -1.792,10.995 -1.906,11.193 -2.067,11.354 -2.265,11.468 -2.486,11.528 -2.6,11.535 -2.6,11.975 -2.5,11.971 -2.304,11.937 -2.114,11.875 -1.935,11.787 -1.77,11.675 -1.622,11.54 -1.495,11.387 -1.39,11.217 -1.35,11.126
  region: -1.35,6.81 -2.6,6.81 -2.6,3.835 -2.486,3.828 -2.265,3.768 -2.067,3.654 -1.906,3.493 -1.792,3.295 -1.732,3.074 -1.732,2.846 -1.792,2.625 -1.906,2.427 -2.067,2.266 -2.265,2.152 -2.486,2.092 -2.6,2.085 -2.6,1.645 -2.5,1.649 -2.304,1.683 -2.114,1.745 -1.935,1.833 -1.77,1.945 -1.622,2.08 -1.495,2.233 -1.39,2.403 -1.35,2.494
  region: -6.6,4.11 -6.6,4.036 -6.629,3.891 -6.685,3.755 -6.767,3.632 -6.872,3.527 -6.995,3.445 -7.131,3.389 -7.276,3.36 -7.35,3.36 -7.35,5.335 -7.257,5.344 -7.086,5.415 -6.955,5.546 -6.884,5.717 -6.884,5.903 -6.955,6.074 -7.086,6.205 -7.257,6.276 -7.35,6.285 -7.35,6.56 -7.276,6.56 -7.131,6.531 -6.995,6.475 -6.872,6.393 -6.767,6.288 -6.685,6.165 -6.629,6.029 -6.6,5.884 -6.6,5.81
  region: -6.1,4.11 -6.1,4.036 -6.071,3.891 -6.015,3.755 -5.933,3.632 -5.828,3.527 -5.705,3.445 -5.569,3.389 -5.424,3.36 -5.35,3.36 -5.35,5.335 -5.443,5.344 -5.614,5.415 -5.745,5.546 -5.816,5.717 -5.816,5.903 -5.745,6.074 -5.614,6.205 -5.443,6.276 -5.35,6.285 -5.35,6.56 -5.424,6.56 -5.569,6.531 -5.705,6.475 -5.828,6.393 -5.933,6.288 -6.015,6.165 -6.071,6.029 -6.1,5.884 -6.1,5.81
  region: -4.6,4.11 -4.6,4.036 -4.629,3.891 -4.685,3.755 -4.767,3.632 -4.872,3.527 -4.995,3.445 -5.131,3.389 -5.276,3.36 -5.35,3.36 -5.35,5.335 -5.257,5.344 -5.086,5.415 -4.955,5.546 -4.884,5.717 -4.884,5.903 -4.955,6.074 -5.086,6.205 -5.257,6.276 -5.35,6.285 -5.35,6.56 -5.276,6.56 -5.131,6.531 -4.995,6.475 -4.872,6.393 -4.767,6.288 -4.685,6.165 -4.629,6.029 -4.6,5.884 -4.6,5.81
  region: -6.1,9.51 -6.1,9.584 -6.071,9.729 -6.015,9.865 -5.933,9.988 -5.828,10.093 -5.705,10.175 -5.569,10.231 -5.424,10.26 -5.35,10.26 -5.35,8.285 -5.443,8.276 -5.614,8.205 -5.745,8.074 -5.816,7.903 -5.816,7.717 -5.745,7.546 -5.614,7.415 -5.443,7.344 -5.35,7.335 -5.35,7.06 -5.424,7.06 -5.569,7.089 -5.705,7.145 -5.828,7.227 -5.933,7.332 -6.015,7.455 -6.071,7.591 -6.1,7.736 -6.1,7.81
  region: -4.6,9.51 -4.6,9.584 -4.629,9.729 -4.685,9.865 -4.767,9.988 -4.872,10.093 -4.995,10.175 -5.131,10.231 -5.276,10.26 -5.35,10.26 -5.35,8.285 -5.257,8.276 -5.086,8.205 -4.955,8.074 -4.884,7.903 -4.884,7.717 -4.955,7.546 -5.086,7.415 -5.257,7.344 -5.35,7.335 -5.35,7.06 -5.276,7.06 -5.131,7.089 -4.995,7.145 -4.872,7.227 -4.767,7.332 -4.685,7.455 -4.629,7.591 -4.6,7.736 -4.6,7.81
  region: -6.6,9.51 -6.6,9.584 -6.629,9.729 -6.685,9.865 -6.767,9.988 -6.872,10.093 -6.995,10.175 -7.131,10.231 -7.276,10.26 -7.35,10.26 -7.35,8.285 -7.257,8.276 -7.086,8.205 -6.955,8.074 -6.884,7.903 -6.884,7.717 -6.955,7.546 -7.086,7.415 -7.257,7.344 -7.35,7.335 -7.35,7.06 -7.276,7.06 -7.131,7.089 -6.995,7.145 -6.872,7.227 -6.767,7.332 -6.685,7.455 -6.629,7.591 -6.6,7.736 -6.6,7.81
  region: -8.1,9.51 -8.1,9.584 -8.071,9.729 -8.015,9.865 -7.933,9.988 -7.828,10.093 -7.705,10.175 -7.569,10.231 -7.424,10.26 -7.35,10.26 -7.35,8.285 -7.443,8.276 -7.614,8.205 -7.745,8.074 -7.816,7.903 -7.816,7.717 -7.745,7.546 -7.614,7.415 -7.443,7.344 -7.35,7.335 -7.35,7.06 -7.424,7.06 -7.569,7.089 -7.705,7.145 -7.828,7.227 -7.933,7.332 -8.015,7.455 -8.071,7.591 -8.1,7.736 -8.1,7.81
  region: 8.1,9.51 8.1,9.584 8.071,9.729 8.015,9.865 7.933,9.988 7.828,10.093 7.705,10.175 7.569,10.231 7.424,10.26 7.35,10.26 7.35,8.285 7.443,8.276 7.614,8.205 7.745,8.074 7.816,7.903 7.816,7.717 7.745,7.546 7.614,7.415 7.443,7.344 7.35,7.335 7.35,7.06 7.424,7.06 7.569,7.089 7.705,7.145 7.828,7.227 7.933,7.332 8.015,7.455 8.071,7.591 8.1,7.736 8.1,7.81
  region: 6.6,9.51 6.6,9.584 6.629,9.729 6.685,9.865 6.767,9.988 6.872,10.093 6.995,10.175 7.131,10.231 7.276,10.26 7.35,10.26 7.35,8.285 7.257,8.276 7.086,8.205 6.955,8.074 6.884,7.903 6.884,7.717 6.955,7.546 7.086,7.415 7.257,7.344 7.35,7.335 7.35,7.06 7.276,7.06 7.131,7.089 6.995,7.145 6.872,7.227 6.767,7.332 6.685,7.455 6.629,7.591 6.6,7.736 6.6,7.81
  region: 4.6,9.51 4.6,9.584 4.629,9.729 4.685,9.865 4.767,9.988 4.872,10.093 4.995,10.175 5.131,10.231 5.276,10.26 5.35,10.26 5.35,8.285 5.257,8.276 5.086,8.205 4.955,8.074 4.884,7.903 4.884,7.717 4.955,7.546 5.086,7.415 5.257,7.344 5.35,7.335 5.35,7.06 5.276,7.06 5.131,7.089 4.995,7.145 4.872,7.227 4.767,7.332 4.685,7.455 4.629,7.591 4.6,7.736 4.6,7.81
  region: 6.1,9.51 6.1,9.584 6.071,9.729 6.015,9.865 5.933,9.988 5.828,10.093 5.705,10.175 5.569,10.231 5.424,10.26 5.35,10.26 5.35,8.285 5.443,8.276 5.614,8.205 5.745,8.074 5.816,7.903 5.816,7.717 5.745,7.546 5.614,7.415 5.443,7.344 5.35,7.335 5.35,7.06 5.424,7.06 5.569,7.089 5.705,7.145 5.828,7.227 5.933,7.332 6.015,7.455 6.071,7.591 6.1,7.736 6.1,7.81
  region: 4.6,4.11 4.6,4.036 4.629,3.891 4.685,3.755 4.767,3.632 4.872,3.527 4.995,3.445 5.131,3.389 5.276,3.36 5.35,3.36 5.35,5.335 5.257,5.344 5.086,5.415 4.955,5.546 4.884,5.717 4.884,5.903 4.955,6.074 5.086,6.205 5.257,6.276 5.35,6.285 5.35,6.56 5.276,6.56 5.131,6.531 4.995,6.475 4.872,6.393 4.767,6.288 4.685,6.165 4.629,6.029 4.6,5.884 4.6,5.81
  region: 6.1,4.11 6.1,4.036 6.071,3.891 6.015,3.755 5.933,3.632 5.828,3.527 5.705,3.445 5.569,3.389 5.424,3.36 5.35,3.36 5.35,5.335 5.443,5.344 5.614,5.415 5.745,5.546 5.816,5.717 5.816,5.903 5.745,6.074 5.614,6.205 5.443,6.276 5.35,6.285 5.35,6.56 5.424,6.56 5.569,6.531 5.705,6.475 5.828,6.393 5.933,6.288 6.015,6.165 6.071,6.029 6.1,5.884 6.1,5.81
  region: 6.6,4.11 6.6,4.036 6.629,3.891 6.685,3.755 6.767,3.632 6.872,3.527 6.995,3.445 7.131,3.389 7.276,3.36 7.35,3.36 7.35,5.335 7.257,5.344 7.086,5.415 6.955,5.546 6.884,5.717 6.884,5.903 6.955,6.074 7.086,6.205 7.257,6.276 7.35,6.285 7.35,6.56 7.276,6.56 7.131,6.531 6.995,6.475 6.872,6.393 6.767,6.288 6.685,6.165 6.629,6.029 6.6,5.884 6.6,5.81
  region: 1.35,6.81 2.6,6.81 2.6,3.835 2.486,3.828 2.265,3.768 2.067,3.654 1.906,3.493 1.792,3.295 1.732,3.074 1.732,2.846 1.792,2.625 1.906,2.427 2.067,2.266 2.265,2.152 2.486,2.092 2.6,2.085 2.6,1.645 2.5,1.649 2.304,1.683 2.114,1.745 1.935,1.833 1.77,1.945 1.622,2.08 1.495,2.233 1.39,2.403 1.35,2.494
  region: 1.35,6.81 2.6,6.81 2.6,9.785 2.486,9.792 2.265,9.852 2.067,9.966 1.906,10.127 1.792,10.325 1.732,10.546 1.732,10.774 1.792,10.995 1.906,11.193 2.067,11.354 2.265,11.468 2.486,11.528 2.6,11.535 2.6,11.975 2.5,11.971 2.304,11.937 2.114,11.875 1.935,11.787 1.77,11.675 1.622,11.54 1.495,11.387 1.39,11.217 1.35,11.126
  region: 11.35,6.81 10.1,6.81 10.1,9.785 10.214,9.792 10.435,9.852 10.633,9.966 10.794,10.127 10.908,10.325 10.968,10.546 10.968,10.774 10.908,10.995 10.794,11.193 10.633,11.354 10.435,11.468 10.214,11.528 10.1,11.535 10.1,11.975 10.2,11.971 10.396,11.937 10.586,11.875 10.765,11.787 10.93,11.675 11.078,11.54 11.205,11.387 11.31,11.217 11.35,11.126
  region: 8.1,4.11 8.1,4.036 8.071,3.891 8.015,3.755 7.933,3.632 7.828,3.527 7.705,3.445 7.569,3.389 7.424,3.36 7.35,3.36 7.35,5.335 7.443,5.344 7.614,5.415 7.745,5.546 7.816,5.717 7.816,5.903 7.745,6.074 7.614,6.205 7.443,6.276 7.35,6.285 7.35,6.56 7.424,6.56 7.569,6.531 7.705,6.475 7.828,6.393 7.933,6.288 8.015,6.165 8.071,6.029 8.1,5.884 8.1,5.81
  region: 10.1,1.645 9.995,1.645 9.786,1.675 9.584,1.733 9.392,1.819 9.214,1.931 9.053,2.067 8.913,2.224 8.796,2.399 8.75,2.494 8.75,6.57 8.797,6.575 8.883,6.61 8.95,6.677 8.985,6.763 8.99,6.81 10.1,6.81 10.1,3.835 9.986,3.828 9.765,3.768 9.567,3.654 9.406,3.493 9.292,3.295 9.232,3.074 9.232,2.846 9.292,2.625 9.406,2.427 9.567,2.266 9.765,2.152 9.986,2.092 10.1,2.085
  region: 11.35,6.81 10.1,6.81 10.1,3.835 10.214,3.828 10.435,3.768 10.633,3.654 10.794,3.493 10.908,3.295 10.968,3.074 10.968,2.846 10.908,2.625 10.794,2.427 10.633,2.266 10.435,2.152 10.214,2.092 10.1,2.085 10.1,1.645 10.2,1.649 10.396,1.683 10.586,1.745 10.765,1.833 10.93,1.945 11.078,2.08 11.205,2.233 11.31,2.403 11.35,2.494
  region: 10.1,11.975 9.995,11.975 9.786,11.945 9.584,11.887 9.392,11.801 9.214,11.689 9.053,11.553 8.913,11.396 8.796,11.221 8.75,11.126 8.75,7.05 8.797,7.045 8.883,7.01 8.95,6.943 8.985,6.857 8.99,6.81 10.1,6.81 10.1,9.785 9.986,9.792 9.765,9.852 9.567,9.966 9.406,10.127 9.292,10.325 9.232,10.546 9.232,10.774 9.292,10.995 9.406,11.193 9.567,11.354 9.765,11.468 9.986,11.528 10.1,11.535
  region: 2.6,11.975 2.705,11.975 2.914,11.945 3.116,11.887 3.308,11.801 3.486,11.689 3.647,11.553 3.787,11.396 3.904,11.221 3.95,11.126 3.95,7.05 3.903,7.045 3.817,7.01 3.75,6.943 3.715,6.857 3.71,6.81 2.6,6.81 2.6,9.785 2.714,9.792 2.935,9.852 3.133,9.966 3.294,10.127 3.408,10.325 3.468,10.546 3.468,10.774 3.408,10.995 3.294,11.193 3.133,11.354 2.935,11.468 2.714,11.528 2.6,11.535
  region: 2.6,1.645 2.705,1.645 2.914,1.675 3.116,1.733 3.308,1.819 3.486,1.931 3.647,2.067 3.787,2.224 3.904,2.399 3.95,2.494 3.95,6.57 3.903,6.575 3.817,6.61 3.75,6.677 3.715,6.763 3.71,6.81 2.6,6.81 2.6,3.835 2.714,3.828 2.935,3.768 3.133,3.654 3.294,3.493 3.408,3.295 3.468,3.074 3.468,2.846 3.408,2.625 3.294,2.427 3.133,2.266 2.935,2.152 2.714,2.092 2.6,2.085
  region: -10.1,11.975 -9.995,11.975 -9.786,11.945 -9.584,11.887 -9.392,11.801 -9.214,11.689 -9.053,11.553 -8.913,11.396 -8.796,11.221 -8.75,11.126 -8.75,7.05 -8.797,7.045 -8.883,7.01 -8.95,6.943 -8.985,6.857 -8.99,6.81 -10.1,6.81 -10.1,9.785 -9.986,9.792 -9.765,9.852 -9.567,9.966 -9.406,10.127 -9.292,10.325 -9.232,10.546 -9.232,10.774 -9.292,10.995 -9.406,11.193 -9.567,11.354 -9.765,11.468 -9.986,11.528 -10.1,11.535
  region: -10.1,1.645 -9.995,1.645 -9.786,1.675 -9.584,1.733 -9.392,1.819 -9.214,1.931 -9.053,2.067 -8.913,2.224 -8.796,2.399 -8.75,2.494 -8.75,6.57 -8.797,6.575 -8.883,6.61 -8.95,6.677 -8.985,6.763 -8.99,6.81 -10.1,6.81 -10.1,3.835 -9.986,3.828 -9.765,3.768 -9.567,3.654 -9.406,3.493 -9.292,3.295 -9.232,3.074 -9.232,2.846 -9.292,2.625 -9.406,2.427 -9.567,2.266 -9.765,2.152 -9.986,2.092 -10.1,2.085
  region: -2.6,11.975 -2.705,11.975 -2.914,11.945 -3.116,11.887 -3.308,11.801 -3.486,11.689 -3.647,11.553 -3.787,11.396 -3.904,11.221 -3.95,11.126 -3.95,7.05 -3.903,7.045 -3.817,7.01 -3.75,6.943 -3.715,6.857 -3.71,6.81 -2.6,6.81 -2.6,9.785 -2.714,9.792 -2.935,9.852 -3.133,9.966 -3.294,10.127 -3.408,10.325 -3.468,10.546 -3.468,10.774 -3.408,10.995 -3.294,11.193 -3.133,11.354 -2.935,11.468 -2.714,11.528 -2.6,11.535
  region: -2.6,1.645 -2.705,1.645 -2.914,1.675 -3.116,1.733 -3.308,1.819 -3.486,1.931 -3.647,2.067 -3.787,2.224 -3.904,2.399 -3.95,2.494 -3.95,6.57 -3.903,6.575 -3.817,6.61 -3.75,6.677 -3.715,6.763 -3.71,6.81 -2.6,6.81 -2.6,3.835 -2.714,3.828 -2.935,3.768 -3.133,3.654 -3.294,3.493 -3.408,3.295 -3.468,3.074 -3.468,2.846 -3.408,2.625 -3.294,2.427 -3.133,2.266 -2.935,2.152 -2.714,2.092 -2.6,2.085
Top Overlay:
  lines w0.2: -11.85,7.343 -11.85,12.56 cw(c-11.65,12.56) -11.65,12.76 -10.85,12.76 10.85,12.76 11.65,12.76 cw(c11.65,12.56) 11.85,12.56 11.85,7.343 ; -10.85,1.426 -10.85,-0.24 ; 10.85,1.426 10.85,-0.24 ; -10.85,-0.24 cw(c-10.65,-0.24) -10.65,-0.04 10.65,-0.04 cw(c10.65,-0.24) 10.85,-0.24 ; -10.85,-0.24 -10.85,-0.59 ccw(c-10.65,-0.59) -10.65,-0.79 10.65,-0.79 ccw(c10.65,-0.59) 10.85,-0.59 10.85,-0.24
Top Paste:
  drawing of 20 lines, arcs and shapes, not listed
Keep-Out Layer:
  region: -0.7,10.66 -0.753,11.108 -0.911,11.531 -1.192,11.945 -1.208,11.989 -1.207,12.611 -1.187,12.66 -1.143,12.76 1.143,12.76 1.187,12.66 1.207,12.611 1.208,11.989 1.192,11.945 0.911,11.531 0.753,11.108 0.7,10.66 0.673,10.56 0.641,10.518 0.551,10.467 -0.551,10.467 -0.641,10.518 -0.673,10.56
  region: -10.85,0 -10.85,0.933 -10.75,1.106 -10.65,1.133 -10.598,1.126 -10.016,1.062 -9.442,1.178 -8.93,1.463 -8.837,1.503 -8.787,1.504 -8.737,1.493 -8.627,1.392 -8.274,0.849 -7.795,0.414 -7.643,0.315 -6.961,0.035 -6.961,-0.003
  region: 10.85,0 10.85,0.933 10.75,1.106 10.65,1.133 10.598,1.126 10.016,1.062 9.442,1.178 8.93,1.463 8.837,1.503 8.787,1.504 8.737,1.493 8.627,1.392 8.274,0.849 7.795,0.414 7.643,0.315 6.961,0.035 6.961,-0.003
Mechanical 3:
  lines w0.1: -12.2,0 12,0
  text "Board Edge" at -12.2,-0.4 h0.2
Mechanical 13:
  drawing of 189 lines, arcs and shapes, not listed
  text ".Designator" at -2.909,0.297 h2.69
Mechanical 15:
  lines w0.05: -12.45,-15.59 -12.45,12.86 12.45,12.86 12.45,-15.59 -12.45,-15.59
  lines w0.1: -0.5,0 0.5,0 ; 0,-0.5 0,0.5
3D body "d4s20p-400A5-D.stp": height 11, standoff -3.2, extent -12.35,-15.49 12.35,12.76